# Altium footprint library Footprints.PcbLib: 196 footprints (part 12 of 13)
Each footprint in its own frame and in the unit in brackets; x right, y up, seen from the top. Pads: shape width x height; smd on the part's side, far side on the other; paste and mask are expansions set on the pad; w line width, h text height; cw(c..) or ccw(c..) is an arc to the next point about the centre after c.
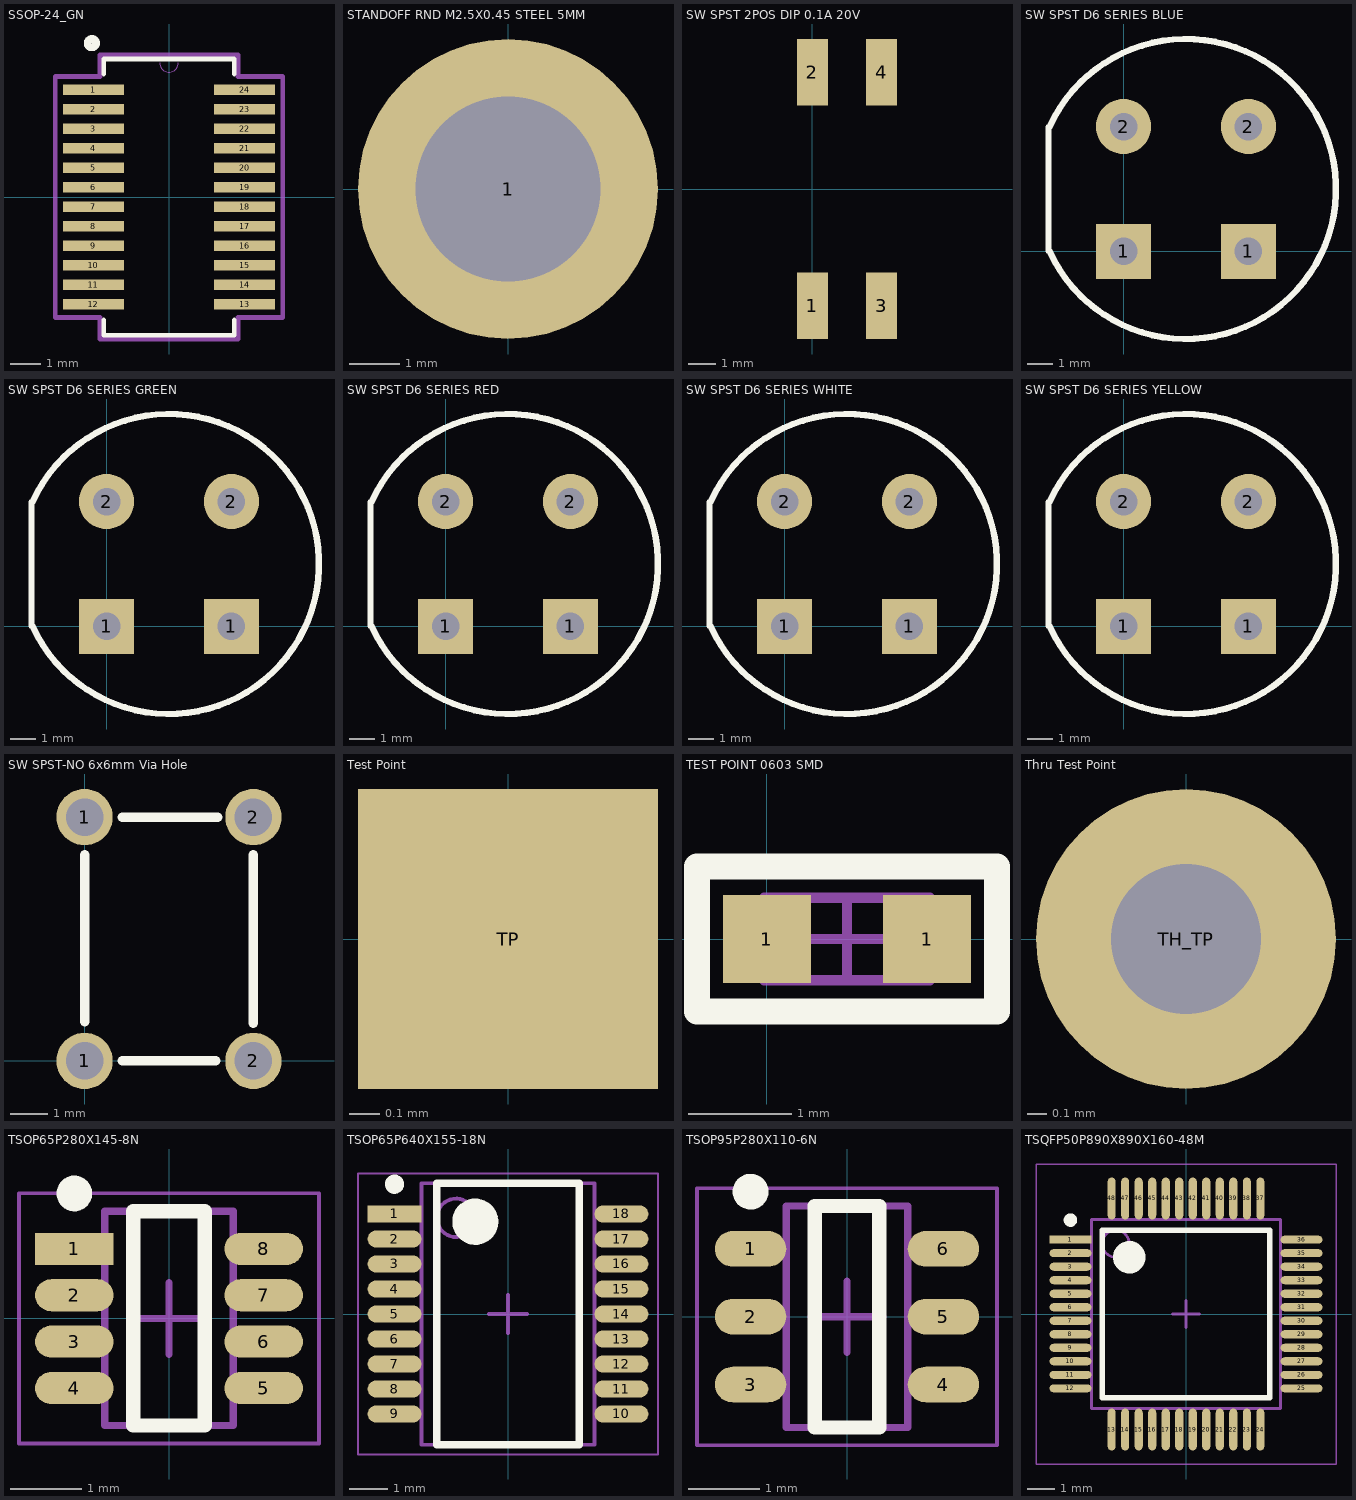
[diagram p11: the footprints below, top view; thin cyan lines are the x and y axes]

## SSOP-24_GN [mil]
pads (24):
  rect 78x14 smd: 1(-97,137.5) 2(-97,112.5) 3(-97,87.5) 4(-97,62.5) 5(-97,37.5) 6(-97,12.5) 7(-97,-12.5) 8(-97,-37.5) 9(-97,-62.5) 10(-97,-87.5) 11(-97,-112.5) 12(-97,-137.5) 13(97,-137.5) 14(97,-112.5) 15(97,-87.5) 16(97,-62.5) 17(97,-37.5) 18(97,-12.5) 19(97,12.5) 20(97,37.5) 21(97,62.5) 22(97,87.5) 23(97,112.5) 24(97,137.5)
Top Overlay:
  circle w10: c-98.94,197.2 r5.35
  lines w6: -83.5,-157.6 -83.5,-177 83.5,-177 83.5,-157.6 ; -83.5,157.6 -83.5,177 83.5,177 83.5,157.6
Mechanical 13:
  lines w0: -12,172 ccw(c0,172) 12,172
Mechanical 15:
  lines w6: -146,-154.5 -88.5,-154.5 -88.5,-182 88.5,-182 88.5,-154.5 146,-154.5 146,154.5 88.5,154.5 88.5,182 -88.5,182 -88.5,154.5 -146,154.5 -146,-154.5
3D body "SSOP-24_GN.stp": height 67.1, standoff 0, extent -122,-172 122,172
3D body: height 10, standoff 0, extent 0,0 10,10

## STANDOFF RND M2.5X0.45 STEEL 5MM [mm]
pads (1):
  round 6 hole 3.7: 1(0,0)
3D body "9774050151R (rev1).stp": height 5, standoff -1.4, extent -2.55,-2.547 2.55,2.547

## SW SPST 2POS DIP 0.1A 20V [mm] "Dip Switch SPST 2 Position Surface Mount Slide (Standard) Actuator 100mA 20VDC"
pads (4):
  rect 1.13x2.44 smd: 1(0,-4.3) 2(0,4.3) 3(2.54,-4.3) 4(2.54,4.3)
3D body: height 4.4, standoff 0.25, extent -2.18,-4.96 4.36,4.96

## SW SPST D6 SERIES BLUE [mm]
pads (4):
  rect 2.2x2.2 hole 1.1: 1(0,0) 1(5,0)
  round 2.2 hole 1.1: 2(0,5) 2(5,5)
Top Overlay:
  lines w0.254: -3,0.017 -3,4.983 ; -2.962,0.017 ccw(c2.5,2.5) -2.962,4.983
3D body "CU41MF0002FP-A.stp": height 6.17, standoff -4.55, extent -2.9,-3.5 8.5,8.5

## SW SPST D6 SERIES GREEN [mm]
pads (4):
  rect 2.2x2.2 hole 1.1: 1(0,0) 1(5,0)
  round 2.2 hole 1.1: 2(0,5) 2(5,5)
Top Overlay:
  lines w0.254: -3,0.017 -3,4.983 ; -2.962,0.017 ccw(c2.5,2.5) -2.962,4.983
3D body "CU41MF0002FP-A.stp": height 6.17, standoff -4.55, extent -2.9,-3.5 8.5,8.5

## SW SPST D6 SERIES RED [mm]
pads (4):
  rect 2.2x2.2 hole 1.1: 1(0,0) 1(5,0)
  round 2.2 hole 1.1: 2(0,5) 2(5,5)
Top Overlay:
  lines w0.254: -3,0.017 -3,4.983 ; -2.962,0.017 ccw(c2.5,2.5) -2.962,4.983
3D body "CU41MF0002FP-A.stp": height 6.17, standoff -4.55, extent -2.9,-3.5 8.5,8.5

## SW SPST D6 SERIES WHITE [mm]
pads (4):
  rect 2.2x2.2 hole 1.1: 1(0,0) 1(5,0)
  round 2.2 hole 1.1: 2(0,5) 2(5,5)
Top Overlay:
  lines w0.254: -3,0.017 -3,4.983 ; -2.962,0.017 ccw(c2.5,2.5) -2.962,4.983
3D body "CU41MF0002FP-A.stp": height 6.17, standoff -4.55, extent -2.9,-3.5 8.5,8.5

## SW SPST D6 SERIES YELLOW [mm]
pads (4):
  rect 2.2x2.2 hole 1.1: 1(0,0) 1(5,0)
  round 2.2 hole 1.1: 2(0,5) 2(5,5)
Top Overlay:
  lines w0.254: -3,0.017 -3,4.983 ; -2.962,0.017 ccw(c2.5,2.5) -2.962,4.983
3D body "CU41MF0002FP-A.stp": height 6.17, standoff -4.55, extent -2.9,-3.5 8.5,8.5

## SW SPST-NO 6x6mm Via Hole [mm]
height 9.5
pads (4):
  round 1.5 hole 1: 1(0,0) 1(0,6.5) 2(4.5,0) 2(4.5,6.5)
Top Overlay:
  lines w0.254: 0,1.05 0,5.5 ; 1,0 3.5,0 ; 1,6.5 3.55,6.5 ; 4.5,1 4.5,5.5

## Test Point [mm]
pads (1):
  rect 1x1 smd paste-2: TP(0,0)

## TEST POINT 0603 SMD [mm]
pads (2):
  rect 0.85x0.85 smd paste-2 mask+0.102: 1(0,0)
  rect 0.85x0.85 smd paste-2: 1(1.55,0)
Top Overlay:
  lines w0.254: -0.675,-0.7 -0.675,0.7 2.225,0.7 2.225,-0.7 -0.675,-0.7
Mechanical 13:
  lines w0.1: -0.025,-0.4 1.575,-0.4 1.575,0.4 -0.025,0.4 -0.025,-0.4
Mechanical 15:
  lines w0.05: -0.675,-0.7 2.225,-0.7 2.225,0.7 -0.675,0.7 -0.675,-0.7
  lines w0.1: 0.375,0 1.175,0 ; 0.775,-0.4 0.775,0.4
3D body "c-1625854-3-ba-3d.stp": height 1.09, standoff -0.06, extent -0.025,-0.45 1.575,0.45

## Thru Test Point [mil]
pads (1):
  round 60 hole 30: TH_TP(0,0)

## TSOP65P280X145-8N [mm] "TSOP, 8-Leads, Body 2.90x1.60mm, Pitch 0.65mm, IPC Medium Density"
height 1.45
pads (8):
  rect 1.1x0.45 smd: 1(-1.325,0.975)
  oval 1.1x0.45 smd: 2(-1.325,0.325) 3(-1.325,-0.325) 4(-1.325,-0.975) 5(1.325,-0.975) 6(1.325,-0.325) 7(1.325,0.325) 8(1.325,0.975)
Top Overlay:
  circle w0.25: c-1.325,1.75 r0.125
  lines w0.2: -0.5,-1.5 0.5,-1.5 0.5,1.5 -0.5,1.5 -0.5,-1.5
Mechanical 13:
  lines w0.1: -0.9,-1.5 0.9,-1.5 0.9,1.5 -0.9,1.5 -0.9,-1.5
Mechanical 15:
  lines w0.05: -2.1,-1.75 2.1,-1.75 2.1,1.75 -2.1,1.75 -2.1,-1.75
  lines w0.1: -0.5,0 0.5,0 ; 0,-0.5 0,0.5
3D body "TSOP65P280X145-8N.step": height 1.45, standoff 0.01, extent -1.393,-1.5 1.393,1.5

## TSOP65P640X155-18N [mm] "TSOP, 18-Leads, Body 6.70x4.40mm, Pitch 0.65mm, IPC Medium Density"
height 1.55
pads (18):
  rect 1.4x0.45 smd: 1(-2.95,2.6)
  oval 1.4x0.45 smd: 2(-2.95,1.95) 3(-2.95,1.3) 4(-2.95,0.65) 5(-2.95,0) 6(-2.95,-0.65) 7(-2.95,-1.3) 8(-2.95,-1.95) 9(-2.95,-2.6) 10(2.95,-2.6) 11(2.95,-1.95) 12(2.95,-1.3) 13(2.95,-0.65) 14(2.95,0) 15(2.95,0.65) 16(2.95,1.3) 17(2.95,1.95) 18(2.95,2.6)
Top Overlay:
  circle w0.6: c-0.85,2.4 r0.3
  circle w0.25: c-2.95,3.375 r0.125
  lines w0.2: -1.85,-3.4 1.85,-3.4 1.85,3.4 -1.85,3.4 -1.85,-3.4
Assembly Top:
  circle w0.1: c-1.35,2.5 r0.5
  lines w0.1: -2.25,-3.4 2.25,-3.4 2.25,3.4 -2.25,3.4 -2.25,-3.4
Courtyard Top:
  lines w0.05: -3.9,-3.65 3.9,-3.65 3.9,3.65 -3.9,3.65 -3.9,-3.65
  lines w0.1: -0.5,0 0.5,0 ; 0,-0.5 0,0.5
3D body "TSOP65P640X155-18N.step": height 1.55, standoff 0, extent -3.2,-3.4 3.2,3.4

## TSOP95P280X110-6N [mm] "TSOP, 6-Leads, Body 2.90x1.50mm, Pitch 0.95mm, IPC Medium Density"
height 1.1
pads (6):
  oval 1x0.5 smd: 1(-1.35,0.95) 2(-1.35,0) 3(-1.35,-0.95) 4(1.35,-0.95) 5(1.35,0) 6(1.35,0.95)
Top Overlay:
  circle w0.25: c-1.35,1.75 r0.125
  lines w0.2: -0.45,-1.55 -0.45,1.55 0.45,1.55 0.45,-1.55 -0.45,-1.55
Assembly Top (Mech9):
  lines w0.1: -0.85,-1.55 -0.85,1.55 0.85,1.55 0.85,-1.55 -0.85,-1.55
Courtyard Top (Mech11):
  lines w0.05: -2.1,-1.8 -2.1,1.8 2.1,1.8 2.1,-1.8 -2.1,-1.8
  lines w0.1: -0.5,0 0.5,0 ; 0,-0.5 0,0.5
3D body: height 1.1, standoff 0.1, extent -0.85,-1.55 0.85,1.55

## TSQFP50P890X890X160-48M [mm] "TSQFP, 48-Leads, Body 7.00x7.00mm, Pitch 0.50mm, IPC Low Density"
height 1.6
pads (48):
  rect 1.55x0.3 smd: 1(-4.275,2.75)
  oval 1.55x0.3 smd: 2(-4.275,2.25) 3(-4.275,1.75) 4(-4.275,1.25) 5(-4.275,0.75) 6(-4.275,0.25) 7(-4.275,-0.25) 8(-4.275,-0.75) 9(-4.275,-1.25) 10(-4.275,-1.75) 11(-4.275,-2.25) 12(-4.275,-2.75) 25(4.275,-2.75) 26(4.275,-2.25) 27(4.275,-1.75) 28(4.275,-1.25) 29(4.275,-0.75) 30(4.275,-0.25) 31(4.275,0.25) 32(4.275,0.75) 33(4.275,1.25) 34(4.275,1.75) 35(4.275,2.25) 36(4.275,2.75)
  oval 0.3x1.55 smd: 13(-2.75,-4.275) 14(-2.25,-4.275) 15(-1.75,-4.275) 16(-1.25,-4.275) 17(-0.75,-4.275) 18(-0.25,-4.275) 19(0.25,-4.275) 20(0.75,-4.275) 21(1.25,-4.275) 22(1.75,-4.275) 23(2.25,-4.275) 24(2.75,-4.275) 37(2.75,4.275) 38(2.25,4.275) 39(1.75,4.275) 40(1.25,4.275) 41(0.75,4.275) 42(0.25,4.275) 43(-0.25,4.275) 44(-0.75,4.275) 45(-1.25,4.275) 46(-1.75,4.275) 47(-2.25,4.275) 48(-2.75,4.275)
Top Overlay:
  circle w0.25: c-4.275,3.475 r0.125
  circle w0.6: c-2.1,2.1 r0.3
  lines w0.2: -3.1,-3.1 -3.1,3.1 3.1,3.1 3.1,-3.1 -3.1,-3.1
Mechanical 13:
  circle w0.1: c-2.6,2.6 r0.5
  lines w0.1: -3.5,-3.5 -3.5,3.5 3.5,3.5 3.5,-3.5 -3.5,-3.5
Mechanical 15:
  lines w0.05: -5.55,-5.55 -5.55,5.55 5.55,5.55 5.55,-5.55 -5.55,-5.55
  lines w0.1: -0.5,0 0.5,0 ; 0,-0.5 0,0.5
3D body "TSQFP50P890X890X160-48M.step": height 1.6, standoff 0, extent -4.45,-4.45 4.45,4.45